# Altium footprint library agh_racing_2018.PcbLib: 166 footprints (part 10 of 11)
Each footprint in its own frame and in the unit in brackets; x right, y up, seen from the top. Pads: shape width x height; smd on the part's side, far side on the other; paste and mask are expansions set on the pad; w line width, h text height; cw(c..) or ccw(c..) is an arc to the next point about the centre after c.
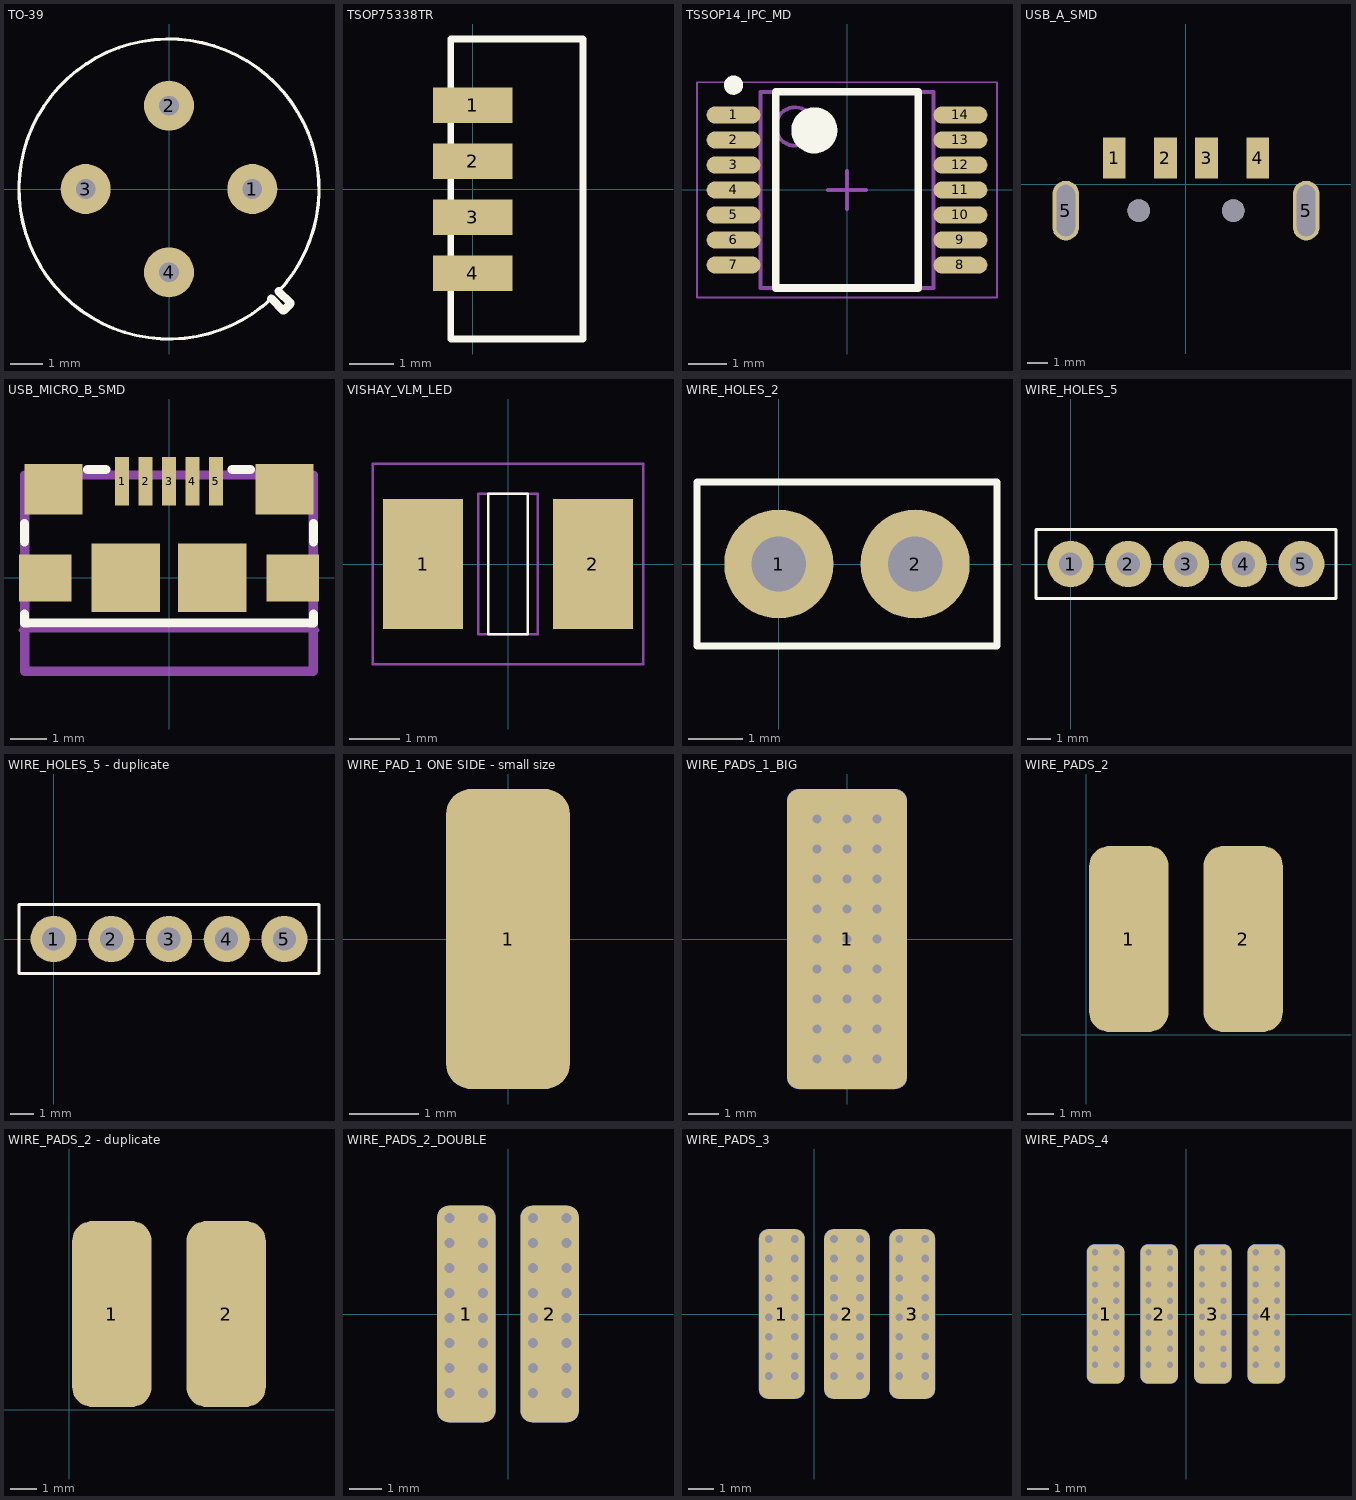
[diagram p9: the footprints below, top view; thin cyan lines are the x and y axes]

## TO-39 [mil]
height 216.93
pads (4):
  round 60 hole 23.62: 1(100,0) 2(0,100) 3(-100,0) 4(0,-100)
Top Overlay:
  lines w3.94: 122.84,-131.73 cw(c0,0) 131.73,-122.84
  lines w10: 122.84,-131.73 136.78,-145.67 ; 131.73,-122.84 145.67,-136.78 145.67,-137.8 137.8,-145.67 ; 136.78,-145.67 137.8,-145.67 ; 136.78,-145.67 137.8,-145.67
3D body "EL-18009-AA Sensor.STEP": height 190.94, standoff -118.11, extent -183.07,-183.07 183.08,183.08

## TSOP75338TR [mm]
pads (4):
  rect 1.8x0.8 smd: 1(0,1.905) 2(0,0.635) 3(0,-0.635) 4(0,-1.905)
Top Overlay:
  lines w0.152: -0.5,-3.395 -0.5,3.405 2.5,3.405 2.5,-3.395 -0.5,-3.395
3D body "TSOP753.STEP": height 3, standoff 0, extent -0.507,-3.5 2.6,3.3

## TSSOP14_IPC_MD [mm] "TSSOP, 14-Leads, Body 5,00x4,40mm, Pitch 0,65mm, IPC Medium Density"
height 1.2
pads (14):
  oval 1.4x0.45 smd: 1(-2.95,1.95) 2(-2.95,1.3) 3(-2.95,0.65) 4(-2.95,0) 5(-2.95,-0.65) 6(-2.95,-1.3) 7(-2.95,-1.95) 8(2.95,-1.95) 9(2.95,-1.3) 10(2.95,-0.65) 11(2.95,0) 12(2.95,0.65) 13(2.95,1.3) 14(2.95,1.95)
Top Overlay:
  circle w0.6: c-0.85,1.55 r0.3
  circle w0.25: c-2.95,2.725 r0.125
  lines w0.2: -1.85,-2.55 1.85,-2.55 1.85,2.55 -1.85,2.55 -1.85,-2.55
Mechanical 13:
  circle w0.1: c-1.35,1.65 r0.5
  lines w0.1: -2.25,-2.55 2.25,-2.55 2.25,2.55 -2.25,2.55 -2.25,-2.55
Mechanical 15:
  lines w0.05: -3.9,-2.8 3.9,-2.8 3.9,2.8 -3.9,2.8 -3.9,-2.8
  lines w0.1: -0.5,0 0.5,0 ; 0,-0.5 0,0.5
3D body "TSSOP14_IPC_MD.step": height 1.2, standoff 0, extent -3.2,-2.55 3.2,2.55

## USB_A_SMD [mm]
pads (8):
  rect 1.1x2 smd: 1(-3.5,1.275) 2(-1,1.275) 3(1,1.275) 4(3.5,1.275)
  oval 1.3x2.9 hole 0.9 slot 2.5 at 90 deg: 5(-5.85,-1.275) 5(5.85,-1.275)
  round 1.1 hole 1.1: ""(-2.3,-1.275) ""(2.3,-1.275)
3D body "USB Series A Plug V2.stp": height 3.15, standoff -3.05, extent -6.5,-18.925 6.5,2.275

## USB_MICRO_B_SMD [mm]
pads (11):
  rect 0.4x1.35 smd: 1(-1.3,2.675) 2(-0.65,2.675) 3(0,2.675) 4(0.65,2.675) 5(1.3,2.675)
  rect 1.45x1.3 smd: ""(-3.425,0) ""(3.425,0)
  rect 1.6x1.4 smd: ""(-3.2,2.45) ""(3.2,2.45)
  rect 1.9x1.9 smd: ""(-1.2,0) ""(1.2,0)
Top Overlay:
  lines w0.254: -4,-1 -4,-1.25 4,-1.25 4,-1 ; -4,1 -4,1.5 ; -2.25,3 -1.75,3 ; 1.75,3 2.25,3 ; 4,1 4,1.5
Mechanical 1:
  lines w0.127: -4.1,-1.45 4.1,-1.45
Mechanical 13:
  lines w0.254: -3.99,-2.581 -3.99,2.85 3.991,2.85 3.991,-2.581 -3.99,-2.581
3D body "molex_0473460001.STEP": height 2.73, standoff -0.04, extent -3.99,-2.581 3.991,2.85

## VISHAY_VLM_LED [mm] "LED; SMD; 3528,PLCC2; zielony; 7,1-28mcd; 3,5x2,8x1,75mm; 120°"
height 2
pads (2):
  rect 1.6x2.6 smd: 1(-1.7,0) 2(1.7,0)
Top Overlay:
  lines w0.05: -0.4,-1.4 -0.4,1.4 0.4,1.4 0.4,-1.4 -0.4,-1.4
Mechanical 13:
  lines w0.05: -0.6,-1.4 -0.6,1.4 0.6,1.4 0.6,-1.4 -0.6,-1.4
Mechanical 15:
  lines w0.05: -2.7,-2 -2.7,2 2.7,2 2.7,-2 -2.7,-2
3D body "LED.STEP": height 1.75, standoff 0, extent -1.78,-1.4 1.78,1.4

## WIRE_HOLES_2 [mm] "Wire Holes, 2-pin"
pads (2):
  round 2 hole 1: 1(0,0) 2(2.5,0)
Top Overlay:
  lines w0.127: -1.5,-1.5 -1.5,1.5 4,1.5 4,-1.5 -1.5,-1.5

## WIRE_HOLES_5 [mm] "Wire Holes, 5-pin"
pads (5):
  round 2 hole 1: 1(0,0) 2(2.5,0) 3(5,0) 4(7.5,0) 5(10,0)
Top Overlay:
  lines w0.127: -1.5,-1.5 -1.5,1.5 11.5,1.5 11.5,-1.5 -1.5,-1.5

## WIRE_HOLES_5 - duplicate [mm] "Wire Holes, 5-pin"
pads (5):
  round 2 hole 1: 1(0,0) 2(2.5,0) 3(5,0) 4(7.5,0) 5(10,0)
Top Overlay:
  lines w0.127: -1.5,-1.5 -1.5,1.5 11.5,1.5 11.5,-1.5 -1.5,-1.5

## WIRE_PAD_1 ONE SIDE - small size [mil] "Wire Pads 2 Footprint"
pads (1):
  rrect40% 70x170 smd: 1(0,0)

## WIRE_PADS_1_BIG [mm]
pads (2):
  rrect20% 4x10 smd: 1(0,0)
  rrect20% 4x10 smd far side: 1(0,0)
via 1,-4 diameter 0.711 hole 0.3
via 1,-3 diameter 0.711 hole 0.3
via 1,-2 diameter 0.711 hole 0.3
via 1,-1 diameter 0.711 hole 0.3
via 0,-1 diameter 0.711 hole 0.3
via 0,-2 diameter 0.711 hole 0.3
via 0,-3 diameter 0.711 hole 0.3
via 0,-4 diameter 0.711 hole 0.3
via -1,-4 diameter 0.711 hole 0.3
via -1,-3 diameter 0.711 hole 0.3
via -1,-2 diameter 0.711 hole 0.3
via -1,-1 diameter 0.711 hole 0.3
via -1,0 diameter 0.711 hole 0.3
via 0,0 diameter 0.711 hole 0.3
via 1,0 diameter 0.711 hole 0.3
via 1,1 diameter 0.711 hole 0.3
via 1,2 diameter 0.711 hole 0.3
via 0,1 diameter 0.711 hole 0.3
via 0,2 diameter 0.711 hole 0.3
via 0,2 diameter 0.711 hole 0.3
via -1,2 diameter 0.711 hole 0.3
via -1,1 diameter 0.711 hole 0.3
via -1,3 diameter 0.711 hole 0.3
via 0,3 diameter 0.711 hole 0.3
via 1,3 diameter 0.711 hole 0.3
via 1,4 diameter 0.711 hole 0.3
via 0,4 diameter 0.711 hole 0.3
via -1,4 diameter 0.711 hole 0.3

## WIRE_PADS_2 [mm] "Wire Pads 2 Footprint"
pads (2):
  rrect50% 3x7 smd: 1(1.6,3.6) 2(5.9,3.6)

## WIRE_PADS_2 - duplicate [mm] "Wire Pads 2 Footprint"
pads (2):
  rrect50% 3x7 smd: 1(1.6,3.6) 2(5.9,3.6)

## WIRE_PADS_2_DOUBLE [mil]
pads (4):
  rrect40% 70x260 smd: 1(-50,0) 2(50,0)
  rrect40% 70x260 smd far side: 1(-50,0) 2(50,0)
via -70,115 diameter 28 hole 11.81
via -70,85 diameter 28 hole 11.81
via -70,55 diameter 28 hole 11.81
via -70,25 diameter 28 hole 11.81
via -70,-5 diameter 28 hole 11.81
via -70,-35 diameter 28 hole 11.81
via -70,-65 diameter 28 hole 11.81
via -70,-95 diameter 28 hole 11.81
via -30,-95 diameter 28 hole 11.81
via -30,-65 diameter 28 hole 11.81
via -30,-35 diameter 28 hole 11.81
via -30,-5 diameter 28 hole 11.81
via -30,25 diameter 28 hole 11.81
via -30,55 diameter 28 hole 11.81
via -30,85 diameter 28 hole 11.81
via -30,115 diameter 28 hole 11.81
via 70,115 diameter 28 hole 11.81
via 70,85 diameter 28 hole 11.81
via 70,55 diameter 28 hole 11.81
via 70,25 diameter 28 hole 11.81
via 70,-5 diameter 28 hole 11.81
via 70,-35 diameter 28 hole 11.81
via 70,-65 diameter 28 hole 11.81
via 70,-95 diameter 28 hole 11.81
via 30,-95 diameter 28 hole 11.81
via 30,-65 diameter 28 hole 11.81
via 30,-35 diameter 28 hole 11.81
via 30,-5 diameter 28 hole 11.81
via 30,25 diameter 28 hole 11.81
via 30,55 diameter 28 hole 11.81
via 30,85 diameter 28 hole 11.81
via 30,115 diameter 28 hole 11.81

## WIRE_PADS_3 [mil]
pads (6):
  rrect40% 70x260 smd: 1(-50,0) 2(50,0) 3(150,0)
  rrect40% 70x260 smd far side: 1(-50,0) 2(50,0) 3(150,0)
via -70,115 diameter 28 hole 11.81
via -70,85 diameter 28 hole 11.81
via -70,55 diameter 28 hole 11.81
via -70,25 diameter 28 hole 11.81
via -70,-5 diameter 28 hole 11.81
via -70,-35 diameter 28 hole 11.81
via -70,-65 diameter 28 hole 11.81
via -70,-95 diameter 28 hole 11.81
via -30,-95 diameter 28 hole 11.81
via -30,-65 diameter 28 hole 11.81
via -30,-35 diameter 28 hole 11.81
via -30,-5 diameter 28 hole 11.81
via -30,25 diameter 28 hole 11.81
via -30,55 diameter 28 hole 11.81
via -30,85 diameter 28 hole 11.81
via -30,115 diameter 28 hole 11.81
via 70,115 diameter 28 hole 11.81
via 70,85 diameter 28 hole 11.81
via 70,55 diameter 28 hole 11.81
via 70,25 diameter 28 hole 11.81
via 70,-5 diameter 28 hole 11.81
via 70,-35 diameter 28 hole 11.81
via 70,-65 diameter 28 hole 11.81
via 70,-95 diameter 28 hole 11.81
via 30,-95 diameter 28 hole 11.81
via 30,-65 diameter 28 hole 11.81
via 30,-35 diameter 28 hole 11.81
via 30,-5 diameter 28 hole 11.81
via 30,25 diameter 28 hole 11.81
via 30,55 diameter 28 hole 11.81
via 30,85 diameter 28 hole 11.81
via 30,115 diameter 28 hole 11.81
via 130,115 diameter 28 hole 11.81
via 130,85 diameter 28 hole 11.81
via 130,55 diameter 28 hole 11.81
via 130,25 diameter 28 hole 11.81
via 130,-5 diameter 28 hole 11.81
via 130,-35 diameter 28 hole 11.81
via 130,-65 diameter 28 hole 11.81
via 130,-95 diameter 28 hole 11.81
via 170,-95 diameter 28 hole 11.81
via 170,-65 diameter 28 hole 11.81
via 170,-35 diameter 28 hole 11.81
via 170,-5 diameter 28 hole 11.81
via 170,25 diameter 28 hole 11.81
via 170,55 diameter 28 hole 11.81
via 170,85 diameter 28 hole 11.81
via 170,115 diameter 28 hole 11.81

## WIRE_PADS_4 [mil] "Wire Pads 2 Footprint"
pads (8):
  rrect40% 70x260 smd: 1(-150,0) 2(-50,0) 3(50,0) 4(150,0)
  rrect40% 70x260 smd far side: 1(-150,0) 2(-50,0) 3(50,0) 4(150,0)
via 130,115 diameter 23 hole 11.81
via 130,85 diameter 23 hole 11.81
via 130,55 diameter 23 hole 11.81
via 130,25 diameter 23 hole 11.81
via 130,-5 diameter 23 hole 11.81
via 130,-35 diameter 23 hole 11.81
via 130,-65 diameter 23 hole 11.81
via 130,-95 diameter 23 hole 11.81
via 170,-95 diameter 23 hole 11.81
via 170,-65 diameter 23 hole 11.81
via 170,-35 diameter 23 hole 11.81
via 170,-5 diameter 23 hole 11.81
via 170,25 diameter 23 hole 11.81
via 170,55 diameter 23 hole 11.81
via 170,85 diameter 23 hole 11.81
via 170,115 diameter 23 hole 11.81
via 30,115 diameter 23 hole 11.81
via 30,85 diameter 23 hole 11.81
via 30,55 diameter 23 hole 11.81
via 30,25 diameter 23 hole 11.81
via 30,-5 diameter 23 hole 11.81
via 30,-35 diameter 23 hole 11.81
via 30,-65 diameter 23 hole 11.81
via 30,-95 diameter 23 hole 11.81
via 70,-95 diameter 23 hole 11.81
via 70,-65 diameter 23 hole 11.81
via 70,-35 diameter 23 hole 11.81
via 70,-5 diameter 23 hole 11.81
via 70,25 diameter 23 hole 11.81
via 70,55 diameter 23 hole 11.81
via 70,85 diameter 23 hole 11.81
via 70,115 diameter 23 hole 11.81
via -70,115 diameter 23 hole 11.81
via -70,85 diameter 23 hole 11.81
via -70,55 diameter 23 hole 11.81
via -70,25 diameter 23 hole 11.81
via -70,-5 diameter 23 hole 11.81
via -70,-35 diameter 23 hole 11.81
via -70,-65 diameter 23 hole 11.81
via -70,-95 diameter 23 hole 11.81
via -30,-95 diameter 23 hole 11.81
via -30,-65 diameter 23 hole 11.81
via -30,-35 diameter 23 hole 11.81
via -30,-5 diameter 23 hole 11.81
via -30,25 diameter 23 hole 11.81
via -30,55 diameter 23 hole 11.81
via -30,85 diameter 23 hole 11.81
via -30,115 diameter 23 hole 11.81
via -130,115 diameter 23 hole 11.81
via -130,85 diameter 23 hole 11.81
via -130,55 diameter 23 hole 11.81
via -130,25 diameter 23 hole 11.81
via -130,-5 diameter 23 hole 11.81
via -130,-35 diameter 23 hole 11.81
via -130,-65 diameter 23 hole 11.81
via -130,-95 diameter 23 hole 11.81
via -170,-95 diameter 23 hole 11.81
via -170,-65 diameter 23 hole 11.81
via -170,-35 diameter 23 hole 11.81
via -170,-5 diameter 23 hole 11.81
via -170,25 diameter 23 hole 11.81
via -170,55 diameter 23 hole 11.81
via -170,85 diameter 23 hole 11.81
via -170,115 diameter 23 hole 11.81